# Altium footprint library PBL - SMD Packages.PcbLib: 218 footprints (part 3 of 14)
Each footprint in its own frame and in the unit in brackets; x right, y up, seen from the top. Pads: shape width x height; smd on the part's side, far side on the other; paste and mask are expansions set on the pad; w line width, h text height; cw(c..) or ccw(c..) is an arc to the next point about the centre after c.
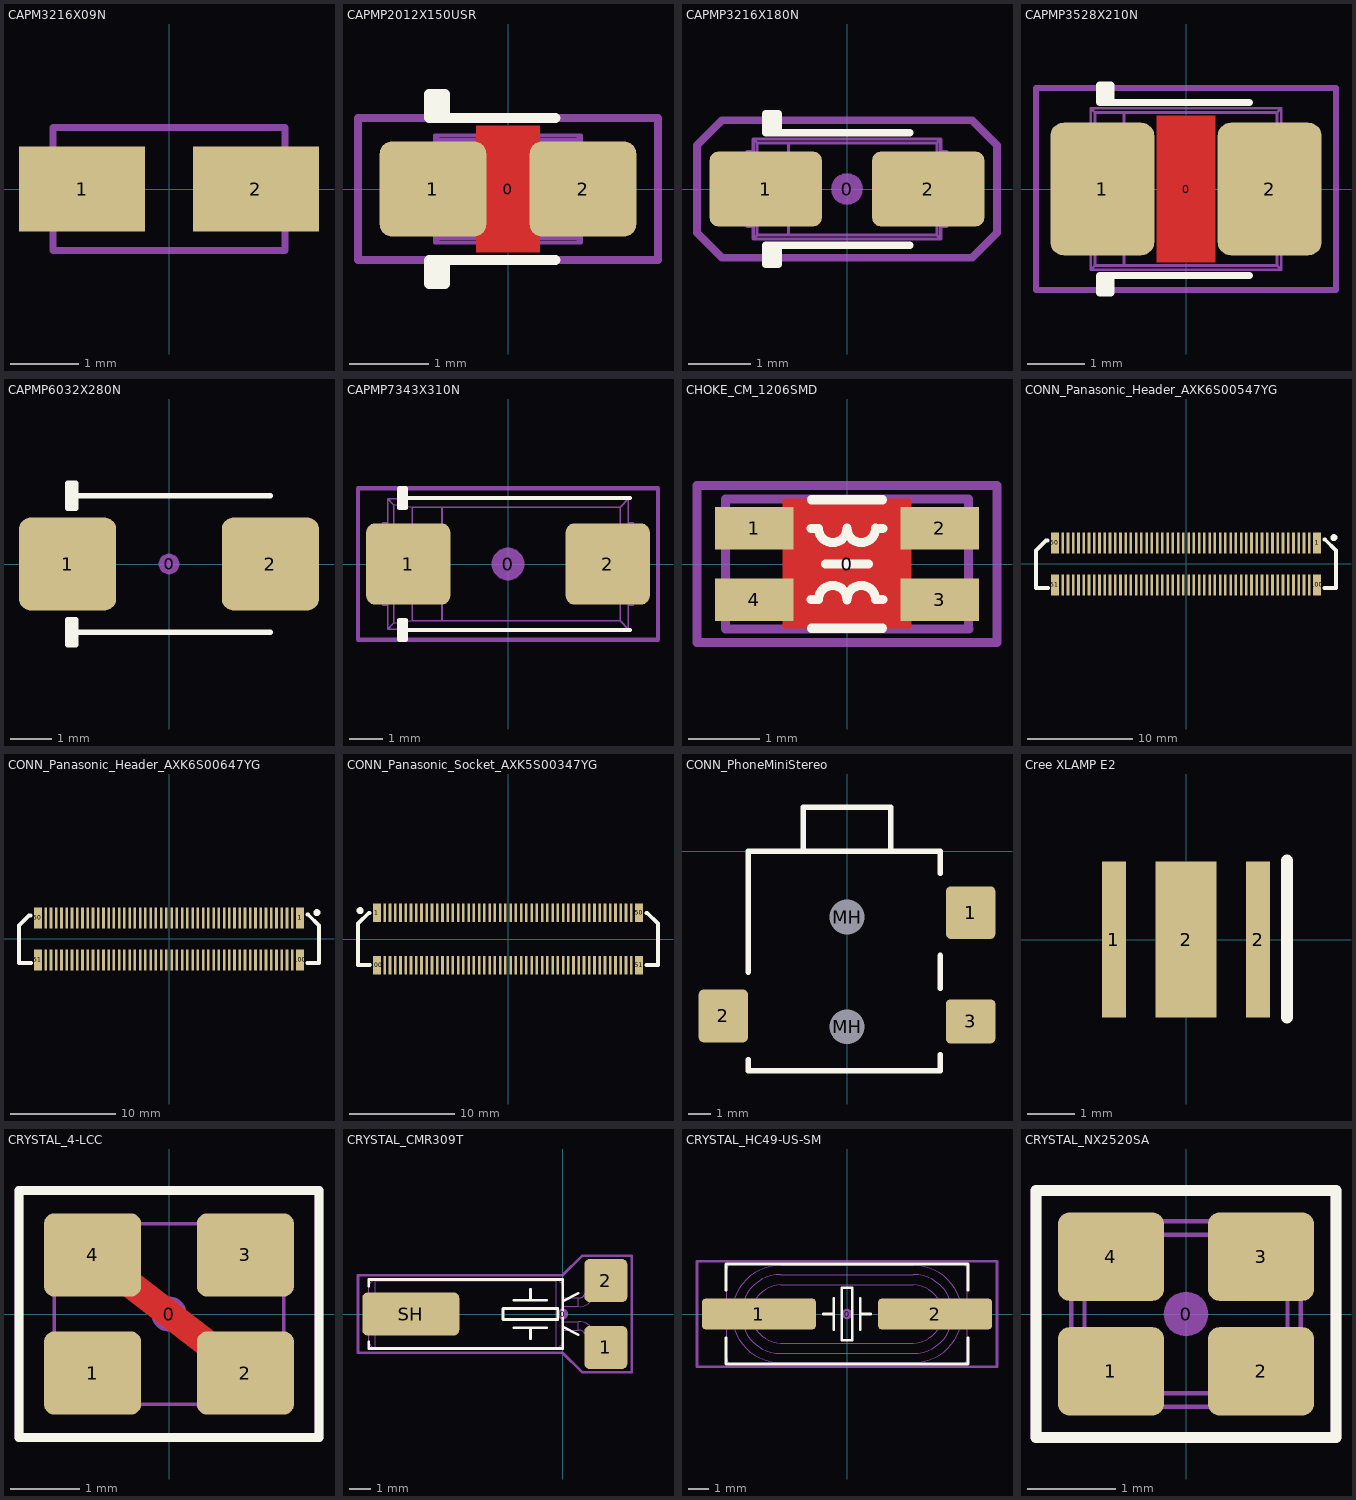
[diagram p2: the footprints below, top view; thin cyan lines are the x and y axes]

## CAPM3216X09N [mm] "Molded Capacitor, 2-Leads, Body 3.20x1.60mm, IPC Medium Density"
height 0.9
pads (2):
  rect 1.85x1.25 smd: 1(-1.275,0) 2(1.275,0)
13 - 3D Top Side:
  lines w0.1: -1.7,-0.9 1.7,-0.9 1.7,0.9 -1.7,0.9 -1.7,-0.9
3D body: height 0.9, standoff 0, extent -1.7,-0.9 1.7,0.9

## CAPMP2012X150USR [mm] "Molded body capacitor, Body 2.0x1.2mm, 0805, IPC Medium Density"
height 1.5
pads (3):
  round 0.254 on Mech15: 0(0,0)
  rrect25% 1.35x1.2 smd: 1(-0.95,0) 2(0.95,0)
Top Layer:
  pour cut-out: -0.4,0.8 0.4,0.8 0.4,-0.8 -0.4,-0.8
Top Overlay:
  lines w0.127: -0.9,-1.2 -0.9,-0.9 ; -0.9,0.9 -0.9,1.2 ; -0.8,-0.9 -0.8,-1.2 -1,-1.2 -1,-0.9 0.6,-0.9 ; -0.8,0.9 -0.8,1.2 -1,1.2 -1,0.9 0.6,0.9
13 - 3D Top Side:
  lines w0.05: -1.025,-0.25 -0.925,-0.25 ; -1.025,0.25 -0.925,0.25 ; -0.925,-0.5 -1.025,-0.5 -1.025,0.5 -0.925,0.5 ; -0.373,-0.623 -0.373,0.623 ; 0.925,-0.5 1.025,-0.5 1.025,0.5 0.925,0.5 ; 0.925,-0.25 1.025,-0.25 ; 0.925,0.25 1.025,0.25 ; -0.925,-0.675 0.925,-0.675 ; -0.925,-0.675 -0.925,0.675 ; -0.925,-0.675 -0.873,-0.623 ; -0.925,0.675 0.925,0.675 ; -0.925,0.675 -0.873,0.623 ; -0.873,-0.623 0.873,-0.623 ; -0.873,-0.623 -0.873,0.623 ; -0.873,0.623 0.873,0.623 ; 0.873,-0.623 0.925,-0.675 ; 0.873,-0.623 0.873,0.623 ; 0.873,0.623 0.925,0.675 ; 0.925,-0.675 0.925,0.675
15 - Top Courtyards:
  lines w0.1: -1.9,-0.9 1.9,-0.9 1.9,0.9 -1.9,0.9 -1.9,-0.9
3D body "CAPMP2012X150N.STEP": height 1.5, standoff 0, extent -1.025,-0.675 1.025,0.675

## CAPMP3216X180N [mm] "Capacitor, polarized, Molded Body, EIA 535BAAC size A; 3.20mm L X 1.60mm W X 1.80mm H"
height 1.8
pads (3):
  round 0.508 on Mech15: 0(0,0)
  rrect25% 1.8x1.2 smd: 1(-1.3,0) 2(1.3,0)
Top Overlay:
  lines w0.127: -1.2,-1.2 -1.2,-0.9 ; -1.2,0.9 -1.2,1.2 ; -1.1,-0.9 -1.1,-1.2 -1.3,-1.2 -1.3,-0.9 1,-0.9 ; -1.1,0.9 -1.1,1.2 -1.3,1.2 -1.3,0.9 1,0.9
13 - 3D Top Side:
  lines w0.05: -1.6,-0.36 -1.499,-0.36 ; -1.6,0.36 -1.499,0.36 ; -1.499,-0.6 -1.6,-0.6 -1.6,0.6 -1.499,0.6 ; -0.937,-0.737 -0.937,0.737 ; 1.499,-0.6 1.6,-0.6 1.6,0.6 1.499,0.6 ; 1.499,-0.36 1.6,-0.36 ; 1.499,0.36 1.6,0.36 ; -1.5,-0.8 -1.5,0.8 ; -1.5,-0.8 1.5,-0.8 ; -1.5,-0.8 -1.437,-0.737 ; -1.5,0.8 1.5,0.8 ; -1.5,0.8 -1.437,0.737 ; -1.437,-0.737 -1.437,0.737 ; -1.437,-0.737 1.437,-0.737 ; -1.437,0.737 1.437,0.737 ; 1.437,-0.737 1.437,0.737 ; 1.437,-0.737 1.5,-0.8 ; 1.437,0.737 1.5,0.8 ; 1.5,-0.8 1.5,0.8
15 - Top Courtyards:
  lines w0.127: -2.4,-0.7 -2,-1.1 2,-1.1 2.4,-0.7 2.4,0.7 2,1.1 -2,1.1 -2.4,0.7 -2.4,-0.7
3D body "CAPMP3216X180N.STEP": height 1.8, standoff 0, extent -1.6,-0.8 1.6,0.8

## CAPMP3528X210N [mm] "Molded body capacitor, Body 3.5x2.8mm, 1210, IPC Nominal settings"
height 2.1
pads (3):
  round 0.254 on Mech15: 0(0,0)
  rrect25% 1.8x2.3 smd: 1(-1.45,0) 2(1.45,0)
Top Layer:
  pour cut-out: -0.508,1.27 0.508,1.27 0.508,-1.27 -0.508,-1.27
Top Overlay:
  lines w0.127: -1.4,-1.8 -1.4,-1.5 ; -1.4,1.5 -1.4,1.8 ; -1.3,-1.5 -1.3,-1.8 -1.5,-1.8 -1.5,-1.5 1.1,-1.5 ; -1.3,1.5 -1.3,1.8 -1.5,1.8 -1.5,1.5 1.1,1.5
13 - 3D Top Side:
  lines w0.05: -1.75,-0.55 -1.65,-0.55 ; -1.75,0.55 -1.65,0.55 ; -1.65,-1.1 -1.75,-1.1 -1.75,1.1 -1.65,1.1 ; -1.077,-1.327 -1.077,1.327 ; 1.65,-1.1 1.75,-1.1 1.75,1.1 1.65,1.1 ; 1.65,-0.55 1.75,-0.55 ; 1.65,0.55 1.75,0.55 ; -1.65,-1.4 1.65,-1.4 ; -1.65,-1.4 -1.65,1.4 ; -1.65,-1.4 -1.577,-1.327 ; -1.65,1.4 1.65,1.4 ; -1.65,1.4 -1.577,1.327 ; -1.577,-1.327 1.577,-1.327 ; -1.577,-1.327 -1.577,1.327 ; -1.577,1.327 1.577,1.327 ; 1.577,-1.327 1.65,-1.4 ; 1.577,-1.327 1.577,1.327 ; 1.577,1.327 1.65,1.4 ; 1.65,-1.4 1.65,1.4
15 - Top Courtyards:
  lines w0.1: -2.6,-1.75 2.6,-1.75 2.6,1.75 -2.6,1.75 -2.6,-1.75
3D body "CAPMP3528X210N.STEP": height 2.1, standoff 0, extent -1.75,-1.4 1.75,1.4

## CAPMP6032X280N [mm] "Capacitor, polarized, Molded Body, EIA 535BAAC size C; 6.00mm L X 3.20mm W X 2.80mm H"
height 2.8
pads (3):
  round 0.508 on Mech15: 0(0,0)
  rrect25% 2.35x2.25 smd: 1(-2.45,0) 2(2.45,0)
Top Overlay:
  lines w0.127: -2.45,-1.65 2.45,-1.65 ; -2.45,1.65 2.45,1.65 ; -2.35,-1.95 -2.35,-1.65 -2.35,-1.35 ; -2.35,1.35 -2.35,1.65 -2.35,1.95 ; -2.45,-1.95 -2.45,-1.35 -2.25,-1.35 -2.25,-1.65 -2.25,-1.95 -2.45,-1.95 ; -2.45,1.35 -2.45,1.95 -2.25,1.95 -2.25,1.65 -2.25,1.35 -2.45,1.35
3D body: height 2.8, standoff 0, extent -3,-1.6 3,1.6

## CAPMP7343X310N [mm] "Molded body capacitor, Body 7.3x4.3mm, 2917, IPC Nominal settings"
height 3.1
pads (3):
  round 1 on Mech15: 0(0,0)
  rrect20% 2.55x2.45 smd: 1(-3.025,0) 2(3.025,0)
Top Overlay:
  lines w0.127: -3.3,-2 3.7,-2 ; -3.3,2 3.7,2 ; -3.2,-2.3 -3.2,-2 -3.2,-1.7 ; -3.2,1.7 -3.2,2 -3.2,2.3 ; -3.3,-2.3 -3.1,-2.3 -3.1,-2 -3.1,-1.7 -3.3,-1.7 -3.3,-2.3 ; -3.3,1.7 -3.1,1.7 -3.1,2 -3.1,2.3 -3.3,2.3 -3.3,1.7
13 - 3D Top Side:
  lines w0.05: -3.8,-0.5 -3.65,-0.5 ; -3.8,0.5 -3.65,0.5 ; -3.67,-0.5 -3.67,0.5 ; -3.65,-1.25 -3.8,-1.25 -3.8,1.25 -3.65,1.25 ; -2.901,-0.575 -2.901,0.575 ; 3.65,-1.25 3.8,-1.25 3.8,1.25 3.65,1.25 ; 3.65,-0.5 3.8,-0.5 ; 3.65,0.5 3.8,0.5 ; 3.67,-0.5 3.67,0.5 ; -3.65,-1.975 3.65,-1.975 ; -3.65,-1.975 -3.471,-1.796 ; -3.65,-1.975 -3.65,1.975 ; -3.65,1.975 -3.471,1.796 ; -3.65,1.975 3.65,1.975 ; -3.471,-1.796 -2.907,-1.727 ; -3.471,-1.796 -3.471,1.796 ; -3.471,1.796 -2.907,1.727 ; -2.907,-1.727 -2.001,-1.727 ; -2.907,-1.727 -2.907,-0.575 -2.001,-0.575 -2.001,-1.727 ; -2.907,1.727 -2.001,1.727 ; -2.907,1.727 -2.907,0.575 -2.001,0.575 -2.001,1.727 ; -2.001,-1.727 3.401,-1.726 ; -2.001,1.727 3.401,1.726 ; 3.401,-1.726 3.65,-1.975 ; 3.401,-1.726 3.401,1.726 ; 3.401,1.726 3.65,1.975 ; 3.65,-1.975 3.65,1.975
15 - Top Courtyards:
  lines w0.127: -4.55,-2.3 4.55,-2.3 4.55,2.3 -4.55,2.3 -4.55,-2.3
3D body "CAPMP7343X310N.STEP": height 3.1, standoff 0, extent -3.8,-1.975 3.8,1.975

## CHOKE_CM_1206SMD [mm] "Common-mode choke, Body 3.4x1.8x2.2mm"
height 2.2
pads (5):
  round 0.5 on Mech15: 0(0,0)
  rrect1% 1.1x0.6 smd: 1(-1.3,0.5) 2(1.3,0.5) 3(1.3,-0.5) 4(-1.3,-0.5)
Top Layer:
  pour cut-out: -0.9,0.91 0.9,0.91 0.9,-0.9 -0.9,-0.9
Top Overlay:
  lines w0.127: -0.5,-0.9 0.5,-0.9 ; -0.5,-0.5 -0.4,-0.5 cw(c-0.2,-0.5) 0,-0.5 cw(c0.2,-0.5) 0.4,-0.5 0.5,-0.5 ; -0.5,0.5 -0.4,0.5 ccw(c-0.2,0.5) 0,0.5 ccw(c0.2,0.5) 0.4,0.5 0.5,0.5 ; -0.5,0.9 0.5,0.9 ; -0.3,0 0.3,0
13 - 3D Top Side:
  lines w0.127: 1.7,-0.91 1.7,0.91 -1.7,0.91 -1.7,-0.91 1.71,-0.91
15 - Top Courtyards:
  lines w0.127: -2.1,-1.1 2.1,-1.1 2.1,1.1 -2.1,1.1 -2.1,-1.1
3D body "Common mode choke - 1206 SMD.STEP": height 2.2, standoff 0, extent -1.71,-0.91 1.71,0.91

## CONN_Panasonic_Header_AXK6S00547YG [mm] "Panasonic P5KS 5mm,5.5mm,7mmStack up compatible"
height 4.95
pads (100):
  rect 0.75x2 smd: 1(12.5,2) 50(-12.5,2) 51(-12.5,-2) 100(12.5,-2)
  rect 0.25x2 smd: 2(11.75,2) 3(11.25,2) 4(10.75,2) 5(10.25,2) 6(9.75,2) 7(9.25,2) 8(8.75,2) 9(8.25,2) 10(7.75,2) 11(7.25,2) 12(6.75,2) 13(6.25,2) 14(5.75,2) 15(5.25,2) 16(4.75,2) 17(4.25,2) 18(3.75,2) 19(3.25,2) 20(2.75,2) 21(2.25,2) 22(1.75,2) 23(1.25,2) 24(0.75,2) 25(0.25,2) 26(-0.25,2) 27(-0.75,2) 28(-1.25,2) 29(-1.75,2) 30(-2.25,2) 31(-2.75,2) 32(-3.25,2) 33(-3.75,2) 34(-4.25,2) 35(-4.75,2) 36(-5.25,2) 37(-5.75,2) 38(-6.25,2) 39(-6.75,2) 40(-7.25,2) 41(-7.75,2) 42(-8.25,2) 43(-8.75,2) 44(-9.25,2) 45(-9.75,2) 46(-10.25,2) 47(-10.75,2) 48(-11.25,2) 49(-11.75,2) 52(-11.75,-2) 53(-11.25,-2) 54(-10.75,-2) 55(-10.25,-2) 56(-9.75,-2) 57(-9.25,-2) 58(-8.75,-2) 59(-8.25,-2) 60(-7.75,-2) 61(-7.25,-2) 62(-6.75,-2) 63(-6.25,-2) 64(-5.75,-2) 65(-5.25,-2) 66(-4.75,-2) 67(-4.25,-2) 68(-3.75,-2) 69(-3.25,-2) 70(-2.75,-2) 71(-2.25,-2) 72(-1.75,-2) 73(-1.25,-2) 74(-0.75,-2) 75(-0.25,-2) 76(0.25,-2) 77(0.75,-2) 78(1.25,-2) 79(1.75,-2) 80(2.25,-2) 81(2.75,-2) 82(3.25,-2) 83(3.75,-2) 84(4.25,-2) 85(4.75,-2) 86(5.25,-2) 87(5.75,-2) 88(6.25,-2) 89(6.75,-2) 90(7.25,-2) 91(7.75,-2) 92(8.25,-2) 93(8.75,-2) 94(9.25,-2) 95(9.75,-2) 96(10.25,-2) 97(10.75,-2) 98(11.25,-2) 99(11.75,-2)
Top Overlay:
  circle w0.508: c14.1,2.5 r0.075
  lines w0.381: -13.2,2.225 -13.35,2.225 -14.3,1.275 -14.3,-2.3 -13.175,-2.3 ; 13.2,-2.3 14.3,-2.3 14.3,1.275 13.275,2.3 13.2,2.3
Top Solder:
  rectangle: -12.925,-3.125 12.975,-0.9
  rectangle: -12.625,0.875 12.975,3.1
3D body "axk6s00547y.stp": height 4.3, standoff 0, extent -14.1,-2.5 14.1,2.5

## CONN_Panasonic_Header_AXK6S00647YG [mm] "Panasonic P5KS 6mm,6.5mm,9mm Stack up compatible"
height 4.95
pads (100):
  rect 0.75x2 smd: 1(12.5,2) 50(-12.5,2) 51(-12.5,-2) 100(12.5,-2)
  rect 0.25x2 smd: 2(11.75,2) 3(11.25,2) 4(10.75,2) 5(10.25,2) 6(9.75,2) 7(9.25,2) 8(8.75,2) 9(8.25,2) 10(7.75,2) 11(7.25,2) 12(6.75,2) 13(6.25,2) 14(5.75,2) 15(5.25,2) 16(4.75,2) 17(4.25,2) 18(3.75,2) 19(3.25,2) 20(2.75,2) 21(2.25,2) 22(1.75,2) 23(1.25,2) 24(0.75,2) 25(0.25,2) 26(-0.25,2) 27(-0.75,2) 28(-1.25,2) 29(-1.75,2) 30(-2.25,2) 31(-2.75,2) 32(-3.25,2) 33(-3.75,2) 34(-4.25,2) 35(-4.75,2) 36(-5.25,2) 37(-5.75,2) 38(-6.25,2) 39(-6.75,2) 40(-7.25,2) 41(-7.75,2) 42(-8.25,2) 43(-8.75,2) 44(-9.25,2) 45(-9.75,2) 46(-10.25,2) 47(-10.75,2) 48(-11.25,2) 49(-11.75,2) 52(-11.75,-2) 53(-11.25,-2) 54(-10.75,-2) 55(-10.25,-2) 56(-9.75,-2) 57(-9.25,-2) 58(-8.75,-2) 59(-8.25,-2) 60(-7.75,-2) 61(-7.25,-2) 62(-6.75,-2) 63(-6.25,-2) 64(-5.75,-2) 65(-5.25,-2) 66(-4.75,-2) 67(-4.25,-2) 68(-3.75,-2) 69(-3.25,-2) 70(-2.75,-2) 71(-2.25,-2) 72(-1.75,-2) 73(-1.25,-2) 74(-0.75,-2) 75(-0.25,-2) 76(0.25,-2) 77(0.75,-2) 78(1.25,-2) 79(1.75,-2) 80(2.25,-2) 81(2.75,-2) 82(3.25,-2) 83(3.75,-2) 84(4.25,-2) 85(4.75,-2) 86(5.25,-2) 87(5.75,-2) 88(6.25,-2) 89(6.75,-2) 90(7.25,-2) 91(7.75,-2) 92(8.25,-2) 93(8.75,-2) 94(9.25,-2) 95(9.75,-2) 96(10.25,-2) 97(10.75,-2) 98(11.25,-2) 99(11.75,-2)
Top Overlay:
  circle w0.508: c14.1,2.5 r0.075
  lines w0.381: -13.2,2.225 -13.35,2.225 -14.3,1.275 -14.3,-2.3 -13.175,-2.3 ; 13.2,-2.3 14.3,-2.3 14.3,1.275 13.275,2.3 13.2,2.3
Top Solder:
  rectangle: -12.925,-3.125 12.975,-0.9
  rectangle: -12.625,0.875 12.975,3.1
3D body "PanasonicTall100PosMaleCon.STEP": height 5.3, standoff 0, extent -14.1,-2.5 14.1,2.5

## CONN_Panasonic_Socket_AXK5S00347YG [mm] "Panasonic P5KS 7mm,8mm,9mm Stack up compatible"
height 4.95
pads (100):
  rect 0.75x1.8 smd: 1(-12.5,2.5) 50(12.5,2.5) 51(12.5,-2.5) 100(-12.5,-2.5)
  rect 0.25x1.8 smd: 2(-11.75,2.5) 3(-11.25,2.5) 4(-10.75,2.5) 5(-10.25,2.5) 6(-9.75,2.5) 7(-9.25,2.5) 8(-8.75,2.5) 9(-8.25,2.5) 10(-7.75,2.5) 11(-7.25,2.5) 12(-6.75,2.5) 13(-6.25,2.5) 14(-5.75,2.5) 15(-5.25,2.5) 16(-4.75,2.5) 17(-4.25,2.5) 18(-3.75,2.5) 19(-3.25,2.5) 20(-2.75,2.5) 21(-2.25,2.5) 22(-1.75,2.5) 23(-1.25,2.5) 24(-0.75,2.5) 25(-0.25,2.5) 26(0.25,2.5) 27(0.75,2.5) 28(1.25,2.5) 29(1.75,2.5) 30(2.25,2.5) 31(2.75,2.5) 32(3.25,2.5) 33(3.75,2.5) 34(4.25,2.5) 35(4.75,2.5) 36(5.25,2.5) 37(5.75,2.5) 38(6.25,2.5) 39(6.75,2.5) 40(7.25,2.5) 41(7.75,2.5) 42(8.25,2.5) 43(8.75,2.5) 44(9.25,2.5) 45(9.75,2.5) 46(10.25,2.5) 47(10.75,2.5) 48(11.25,2.5) 49(11.75,2.5) 52(11.75,-2.5) 53(11.25,-2.5) 54(10.75,-2.5) 55(10.25,-2.5) 56(9.75,-2.5) 57(9.25,-2.5) 58(8.75,-2.5) 59(8.25,-2.5) 60(7.75,-2.5) 61(7.25,-2.5) 62(6.75,-2.5) 63(6.25,-2.5) 64(5.75,-2.5) 65(5.25,-2.5) 66(4.75,-2.5) 67(4.25,-2.5) 68(3.75,-2.5) 69(3.25,-2.5) 70(2.75,-2.5) 71(2.25,-2.5) 72(1.75,-2.5) 73(1.25,-2.5) 74(0.75,-2.5) 75(0.25,-2.5) 76(-0.25,-2.5) 77(-0.75,-2.5) 78(-1.25,-2.5) 79(-1.75,-2.5) 80(-2.25,-2.5) 81(-2.75,-2.5) 82(-3.25,-2.5) 83(-3.75,-2.5) 84(-4.25,-2.5) 85(-4.75,-2.5) 86(-5.25,-2.5) 87(-5.75,-2.5) 88(-6.25,-2.5) 89(-6.75,-2.5) 90(-7.25,-2.5) 91(-7.75,-2.5) 92(-8.25,-2.5) 93(-8.75,-2.5) 94(-9.25,-2.5) 95(-9.75,-2.5) 96(-10.25,-2.5) 97(-10.75,-2.5) 98(-11.25,-2.5) 99(-11.75,-2.5)
Top Overlay:
  circle w0.508: c-14.1,2.7 r0.075
  lines w0.381: -13.2,2.5 -13.275,2.5 -14.3,1.475 -14.3,-2.5 -13.175,-2.5 ; 13.2,-2.5 14.3,-2.5 14.3,1.475 13.275,2.5 13.2,2.5
Top Solder:
  rectangle: -12.975,-3.525 12.975,-1.475
  rectangle: -13,1.475 12.975,3.525
3D body "axk5s00347y.STEP": height 6.05, standoff 0, extent -14.1,-2.7 14.1,2.7

## CONN_PhoneMiniStereo [mm] "CUI SJ1-2513-SMT 2.5mm stereo jack"
height 4
pads (5):
  rrect20% 2.25x2.4 smd: 1(5.625,-2.8) 2(-5.625,-7.5)
  rrect20% 2.25x2 smd: 3(5.625,-7.75)
  round 1.524 hole 1.575 unplated: MH(0,-8) MH(0,-3)
Top Overlay:
  lines w0.254: -4.5,-9.5 -4.5,-10 4.25,-10 4.25,-9.275 ; -4.5,-5.5 -4.5,0 4.25,0 4.25,-1 ; -2,0 -2,2 2,2 2,0 ; 4.25,-6.25 4.25,-4.75
3D body "CUI-SJ1-2513-SMT.step": height 4.12, standoff -0.43, extent -6,-10 6,2

## Cree XLAMP E2 [mm]
pads (3):
  rect 0.5x3.3 smd: 1(-1.525,0) 2(1.525,0)
  rect 1.3x3.3 smd: 2(0,0)
Top Overlay:
  lines w0.254: 2.134,-1.651 2.134,1.676
3D body "XLamp_XPG2_3D_STEP.stp": height 2.28, standoff 0.02, extent -1.725,-1.725 1.725,1.725

## CRYSTAL_4-LCC [mm] "SMD Crystal 4-lead leadless package"
height 0.8
pads (5):
  round 0.508 on Mech15: 0(0,0)
  rrect25% 1.4x1.2 smd: 1(-1.1,-0.85) 2(1.1,-0.85) 3(1.1,0.85) 4(-1.1,0.85)
Top Layer:
  lines w0.4: -1.1,0.85 1.1,-0.85
Top Overlay:
  lines w0.127: -2.159,-1.778 -2.159,1.778 2.159,1.778 2.159,-1.778 -2.159,-1.778
13 - 3D Top Side:
  lines w0.05: -1.65,-1.143 -1.493,-1.3 1.493,-1.3 1.65,-1.143 1.65,1.144 1.494,1.3 -1.493,1.3 -1.65,1.143 -1.65,-1.143
15 - Top Courtyards:
  lines w0.127: -2.159,-1.778 2.159,-1.778 2.159,1.778 -2.159,1.778 -2.159,-1.778
3D body "Crystal TXC Corp 7M series.STEP": height 0.8, standoff 0, extent -1.65,-1.3 1.65,1.3

## CRYSTAL_CMR309T [mm] "SMD Crystal CMR309T package"
height 3.1
pads (4):
  round 0.508 on Mech15: 0(0,0)
  rrect25% 2x2 smd: 1(2,-1.55) 2(2,1.55)
  rrect25% 4.5x2 smd: SH(-7.05,0)
Top Overlay:
  lines w0.127: -9,-1.3 -9,-1.6 0,-1.6 0,-0.6 ; -9,1.3 -9,1.6 0,1.6 0,0.6 ; -2.262,-0.635 -0.738,-0.635 ; -2.262,0.635 -0.738,0.635 ; -1.5,-1.143 -1.5,-0.635 ; -1.5,0.635 -1.5,1.143 ; 0.72,-0.96 0,-0.6 ; 0.72,0.96 0,0.6 ; 0,-0.6 0,0.6 ; -2.77,-0.254 -0.23,-0.254 -0.23,0.254 -2.77,0.254 -2.77,-0.254
13 - 3D Top Side:
  lines w0.05: 0,-0.75 0.71,-0.75 ; 0,-0.35 0.71,-0.35 ; 0,0.35 0.71,0.35 ; 0,0.75 0.71,0.75 ; 0.931,-0.79 0.937,-0.798 0.965,-0.823 0.999,-0.84 1.037,-0.85 1.077,-0.851 1.118,-0.843 1.158,-0.828 1.195,-0.805 1.226,-0.776 1.252,-0.741 1.27,-0.704 1.279,-0.664 1.28,-0.625 1.271,-0.588 1.255,-0.555 1.25,-0.548 ; 0.931,0.79 0.937,0.798 0.965,0.823 0.999,0.84 1.037,0.85 1.077,0.851 1.118,0.843 1.158,0.828 1.195,0.805 1.226,0.776 1.252,0.741 1.27,0.704 1.279,0.664 1.28,0.625 1.271,0.588 1.255,0.555 1.25,0.548 ; -8.7,-1.55 cw(c-8.7,-1.25) -9,-1.25 -9,1.25 cw(c-8.7,1.25) -8.7,1.55 ; -8.7,-1.55 -8.7,1.55 ; -8.7,-1.55 -0.3,-1.55 ; -8.7,1.55 -0.3,1.55 ; -0.3,-1.55 ccw(c-0.3,-1.25) 0,-1.25 0,1.25 ccw(c-0.3,1.25) -0.3,1.55 ; -0.3,-1.55 -0.3,1.55 ; 0.71,-0.75 cw(c0.741,-1.171) 0.936,-0.796 1.229,-1.183 ; 0.71,-0.75 0.71,-0.35 ; 0.71,-0.35 cw(c0.757,-1.055) 1.25,-0.548 ; 0.71,0.35 ccw(c0.775,1.007) 1.25,0.548 ; 0.71,0.35 0.71,0.75 ; 0.71,0.75 0.73,0.75 0.773,0.753 0.814,0.758 0.851,0.765 0.881,0.773 0.906,0.781 0.923,0.789 0.933,0.794 0.937,0.797 ; 0.937,0.797 1.229,1.183 ; 0.937,0.797 0.937,0.797 ; 1.229,-1.183 ccw(c2.616,-0.029) 1.491,-1.439 ; 1.229,-1.183 1.236,-1.191 1.263,-1.216 1.297,-1.234 1.335,-1.243 1.376,-1.244 1.417,-1.237 1.456,-1.221 1.493,-1.198 1.525,-1.169 1.55,-1.135 1.568,-1.097 1.577,-1.058 1.578,-1.019 1.569,-0.982 1.553,-0.948 1.548,-0.942 ; 1.229,1.183 cw(c2.589,0.057) 1.491,1.439 ; 1.229,1.183 1.236,1.191 1.263,1.216 1.297,1.234 1.335,1.243 1.376,1.244 1.417,1.237 1.456,1.221 1.493,1.198 1.525,1.169 1.55,1.135 1.568,1.097 1.577,1.058 1.578,1.019 1.569,0.982 1.553,0.948 1.548,0.942 ; 1.25,-0.548 1.548,-0.942 ; 1.25,0.548 1.548,0.942 ; 1.491,-1.439 ccw(c0.753,-0.568) 1.746,-1.132 ; 1.491,-1.439 2.472,-2.254 ccw(c1.735,-1.382) 2.728,-1.946 1.746,-1.132 ; 1.491,1.439 cw(c0.753,0.568) 1.746,1.132 ; 1.491,1.439 2.472,2.254 cw(c1.735,1.382) 2.728,1.946 1.746,1.132 ; 1.548,-0.942 ccw(c2.638,-0.003) 1.746,-1.132 ; 1.548,0.942 cw(c2.604,0.039) 1.746,1.132
15 - Top Courtyards:
  lines w0.127: -9.5,-1.8 0,-1.8 0.9,-2.7 3.2,-2.7 3.2,2.7 0.9,2.7 0,1.8 -9.5,1.8 -9.5,-1.8
3D body "Crystal CMR309T.STEP": height 3.07, standoff -0.01, extent -9,-2.254 2.728,2.254

## CRYSTAL_HC49-US-SM [mm] "SMD Crystal HC49/US-SM package"
height 4.3
pads (3):
  round 0.508 on Mech15: 0(0,0)
  rrect25% 5.5x1.5 smd: 1(-4.25,0) 2(4.25,0)
Top Overlay:
  lines w0.127: -5.842,-1.143 -5.842,-2.413 5.842,-2.413 5.842,-1.143 ; -5.842,1.143 -5.842,2.413 5.842,2.413 5.842,1.143 ; -1.143,0 -0.635,0 ; -0.635,-0.762 -0.635,0.762 ; 0.635,-0.762 0.635,0.762 ; 0.635,0 1.143,0 ; -0.254,-1.27 0.254,-1.27 0.254,1.27 -0.254,1.27 -0.254,-1.27
13 - 3D Top Side:
  lines w0.05: -5.8,-0.45 -6.4,-0.45 -6.4,0.45 -5.8,0.45 ; 5.8,-0.45 6.4,-0.45 6.4,0.45 5.8,0.45 ; -5.8,-2.165 ccw(c-5.55,-2.165) -5.55,-2.415 5.55,-2.415 ccw(c5.55,-2.165) 5.8,-2.165 5.8,2.165 ccw(c5.55,2.165) 5.55,2.415 -5.55,2.415 ccw(c-5.55,2.165) -5.8,2.165 -5.8,-2.165 ; -3.2,-2.35 cw(c-3.2,0) -3.2,2.35 3.2,2.35 cw(c3.2,0) 3.2,-2.35 -3.2,-2.35 ; -3.2,-1.9 cw(c-3.2,0) -3.2,1.9 3.2,1.9 cw(c3.2,0) 3.2,-1.9 -3.2,-1.9 ; -3.2,-1.4 cw(c-3.2,0) -3.2,1.4 3.2,1.4 cw(c3.2,0) 3.2,-1.4 -3.2,-1.4
15 - Top Courtyards:
  lines w0.127: -7.239,-2.54 7.239,-2.54 7.239,2.54 -7.239,2.54 -7.239,-2.54
3D body "Crystal HC49_US-SM.STEP": height 4.29, standoff -0.01, extent -6.4,-2.415 6.4,2.415

## CRYSTAL_NX2520SA [mm] "SMD Crystal 4-lead leadless package"
height 0.55
pads (5):
  round 0.508 on Mech15: 0(0,0)
  rrect25% 1.2x1 smd mask+0.075: 1(-0.85,-0.65) 2(0.85,-0.65) 3(0.85,0.65) 4(-0.85,0.65)
Top Overlay:
  lines w0.127: -1.7,-1.4 -1.7,1.4 1.7,1.4 1.7,-1.4 -1.7,-1.4
13 - 3D Top Side:
  lines w0.05: -1.3,-0.87 cw(c-1.3,-1.05) -1.12,-1.05 1.12,-1.05 cw(c1.3,-1.05) 1.3,-0.87 1.3,0.87 cw(c1.3,1.05) 1.12,1.05 -1.12,1.05 cw(c-1.3,1.05) -1.3,0.87 -1.3,-0.87 ; -1.15,-0.75 ccw(c-1,-0.75) -1,-0.9 1,-0.9 ccw(c1,-0.75) 1.15,-0.75 1.15,0.75 ccw(c1,0.75) 1,0.9 -1,0.9 ccw(c-1,0.75) -1.15,0.75 -1.15,-0.75
15 - Top Courtyards:
  lines w0.127: -1.7,-1.4 1.7,-1.4 1.7,1.4 -1.7,1.4 -1.7,-1.4
3D body "Crystal NDK NX2520SA series.STEP": height 0.55, standoff 0, extent -1.3,-1.05 1.3,1.05